# Altium footprint library HDMI_to_RGB.PcbLib: 21 footprints (part 1 of 2)
Each footprint in its own frame and in the unit in brackets; x right, y up, seen from the top. Pads: shape width x height; smd on the part's side, far side on the other; paste and mask are expansions set on the pad; w line width, h text height; cw(c..) or ccw(c..) is an arc to the next point about the centre after c.
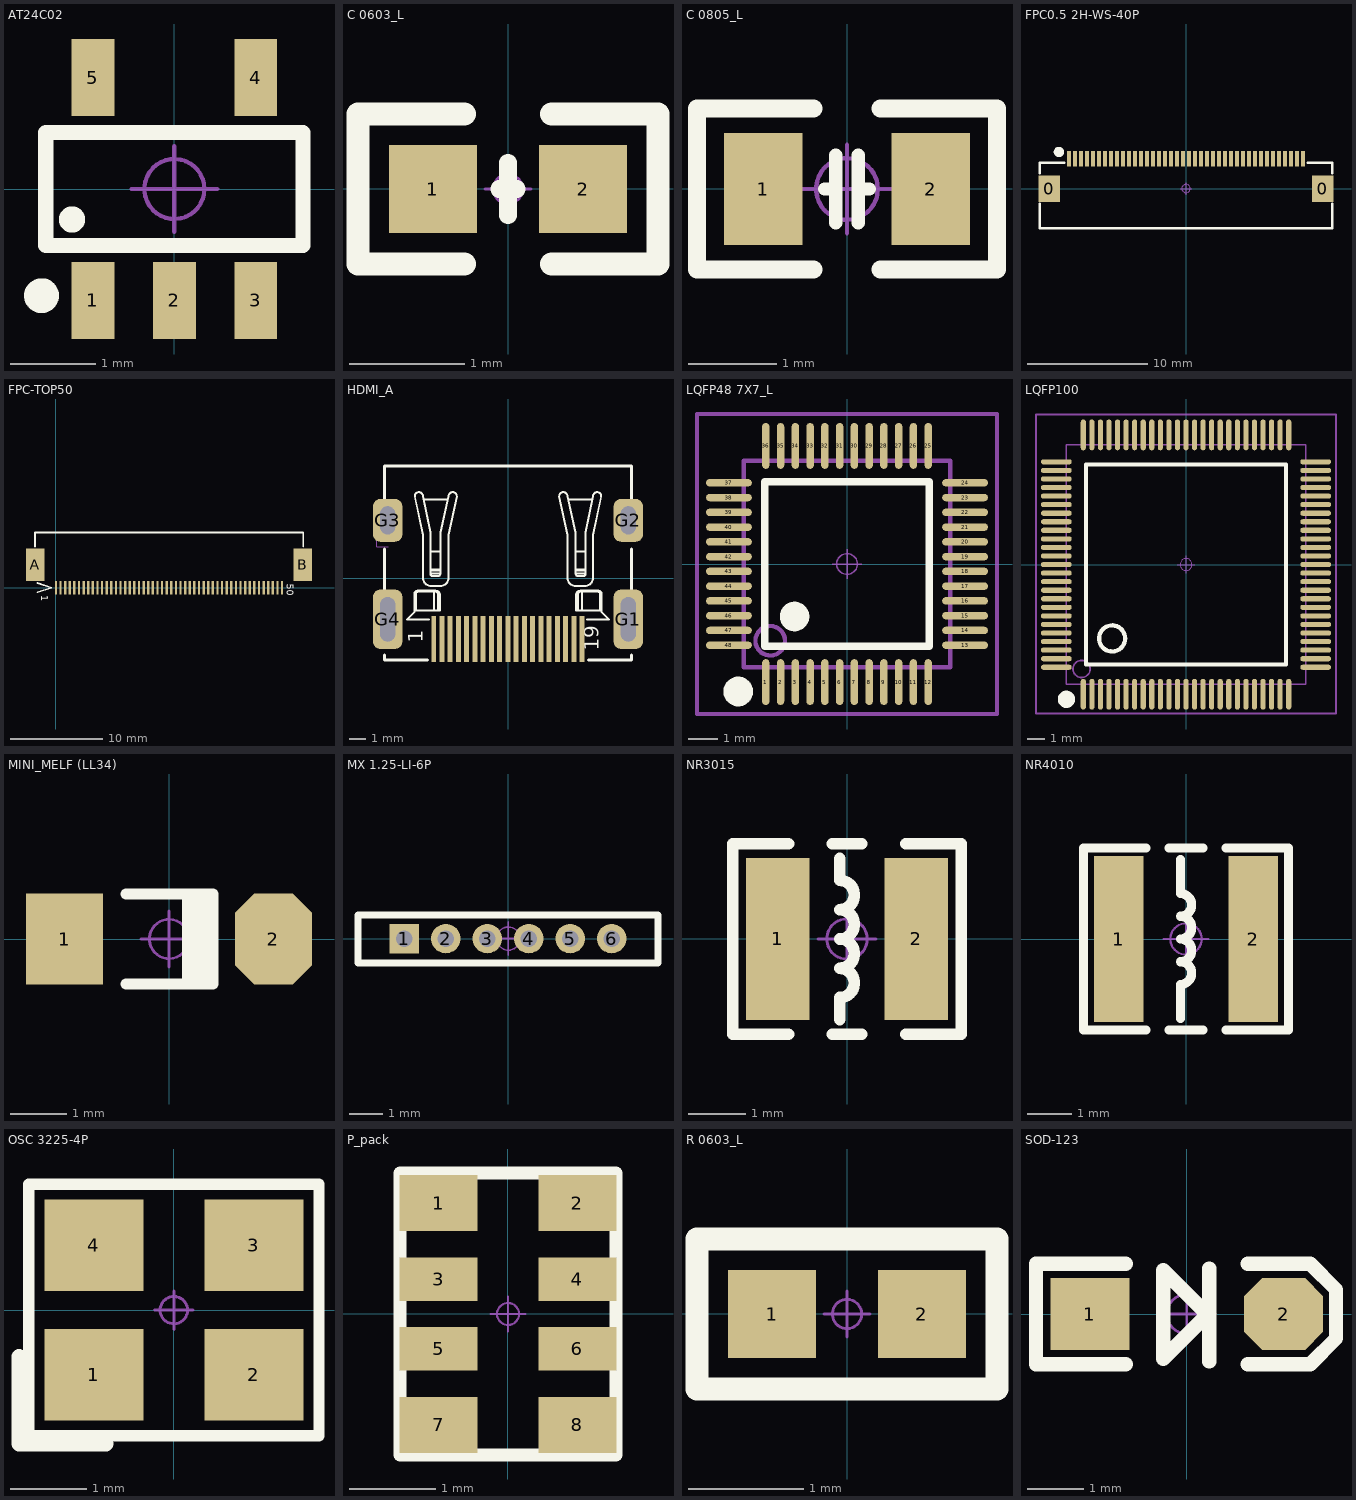
[diagram p0: the footprints below, top view; thin cyan lines are the x and y axes]

## AT24C02 [mm]
pads (5):
  rect 0.5x0.9 smd: 1(-0.95,-1.3) 2(0,-1.3) 3(0.95,-1.3) 4(0.95,1.3) 5(-0.95,1.3)
Top Overlay:
  circle w0.254: c-1.549,-1.245 r0.076
  circle w0.254: c-1.194,-0.356 r0.025
  lines w0.178: -1.5,-0.66 -1.5,0.66 1.5,0.66 1.5,-0.66 -1.5,-0.66
Mechanical 15:
  circle w0.05: c0,0 r0.35
  lines w0.05: -0.5,0 0.5,0 ; 0,-0.5 0,0.5
3D body "SOT23-5.STEP": height 1.15, standoff -0.03, extent -1.5,-1.403 1.5,1.403

## C 0603_L [mil] "无极性贴片电容"
pads (2):
  rect 30x30 smd: 1(-25.59,0) 2(25.59,0)
Top Overlay:
  lines w6: -3,0 0,0 3,0 ; 0,-9 0,9
  lines w8: -15,-25.59 -51.18,-25.59 -51.18,25.59 -15,25.59 ; 15,-25.59 51.18,-25.59 51.18,25.59 15,25.59
Mechanical 15:
  circle w1: c0,0 r5
  lines w1: -7.87,0 7.87,0 ; 0,-7.87 0,7.87
3D body "C 0603.STEP": height 31.89, standoff -0.39, extent -31.5,-16.14 31.5,16.14

## C 0805_L [mil] "无极性贴片电容"
height 19.68
pads (2):
  rect 35x50 smd: 1(-37.4,0) 2(37.4,0)
Top Overlay:
  lines w6: -10,0 -5,0 ; -5,-15 -5,15 ; 5,-15 5,15 ; 5,0 10,0
  lines w8: -15,-36 -66.93,-36 -66.93,36 -15,36 ; 15,-36 66.93,-36 66.93,36 15,36
Mechanical 15:
  circle w1.97: c0,0 r13.78
  circle w1.97: c0,0 r13.78
  lines w1.97: -19.68,0 19.68,0 -19.68,0 ; 0,-19.68 0,19.68 0,-19.68
3D body "C 0805.STEP": height 20.08, standoff -0.39, extent -39.37,-24.02 39.37,24.02

## FPC0.5 2H-WS-40P [mm] "长：24.2mm，宽：5.2mm，高：2mm"
pads (42):
  rect 1.8x2.2 smd: 0(-11.4,0) 0(11.4,0)
  rect 0.3x1.3 smd: 1(-9.75,2.497) 2(-9.25,2.497) 3(-8.75,2.497) 4(-8.25,2.497) 5(-7.75,2.497) 6(-7.25,2.497) 7(-6.75,2.497) 8(-6.25,2.497) 9(-5.75,2.497) 10(-5.25,2.497) 11(-4.75,2.497) 12(-4.25,2.497) 13(-3.75,2.497) 14(-3.25,2.497) 15(-2.75,2.497) 16(-2.25,2.497) 17(-1.75,2.497) 18(-1.25,2.497) 19(-0.75,2.497) 20(-0.25,2.497) 21(0.25,2.497) 22(0.75,2.497) 23(1.25,2.497) 24(1.75,2.497) 25(2.25,2.497) 26(2.75,2.497) 27(3.25,2.497) 28(3.75,2.497) 29(4.25,2.497) 30(4.75,2.497) 31(5.25,2.497) 32(5.75,2.497) 33(6.25,2.497) 34(6.75,2.497) 35(7.25,2.497) 36(7.75,2.497) 37(8.25,2.497) 38(8.75,2.497) 39(9.25,2.497) 40(9.75,2.497)
Top Overlay:
  circle w0.5: c-10.594,3.048 r0.18
  lines w0.2: -12.175,-1.27 -12.175,-3.302 12.175,-3.302 12.175,-1.27 ; -12.175,1.27 -12.175,2.159 -10.143,2.159 ; 10.143,2.159 12.175,2.159 12.175,1.27
Mechanical 15:
  circle w0.05: c0,0 r0.35
  lines w0.05: -0.5,0 0.5,0 ; 0,-0.5 0,0.5
3D body "FPC0.5 2H-S-W-40P.STEP": height 2, standoff -0.01, extent -12.1,-3.15 12.1,2.85

## FPC-TOP50 [mm]
pads (52):
  rect 0.25x1.5 smd: 1(0,0) 2(0.5,0) 3(1,0) 4(1.5,0) 5(2,0) 6(2.5,0) 7(3,0) 8(3.5,0) 9(4,0) 10(4.5,0) 11(5,0) 12(5.5,0) 13(6,0) 14(6.5,0) 15(7,0) 16(7.5,0) 17(8,0) 18(8.5,0) 19(9,0) 20(9.5,0) 21(10,0) 22(10.5,0) 23(11,0) 24(11.5,0) 25(12,0) 26(12.5,0) 27(13,0) 28(13.5,0) 29(14,0) 30(14.5,0) 31(15,0) 32(15.5,0) 33(16,0) 34(16.5,0) 35(17,0) 36(17.5,0) 37(18,0) 38(18.5,0) 39(19,0) 40(19.5,0) 41(20,0) 42(20.5,0) 43(21,0) 44(21.5,0) 45(22,0) 46(22.5,0) 47(23,0) 48(23.5,0) 49(24,0) 50(24.5,0)
  rect 2x3.5 smd: A(-2.25,2.5) B(26.75,2.5)
Top Overlay:
  lines w0.2: -2,-0.5 -0.5,0 -2,0.5
  lines w0.203: -2.286,4.47 -2.286,5.969 22.306,5.969 26.797,5.969 26.797,4.47
  text "50" at 25.022,0.432 h0.76
  text "1" at -1.597,-0.838 h0.76

## HDMI_A [mm]
pads (23):
  rect 0.3x2.794 smd mask+0.05: 1(-4.507,-3.697) 2(-4.007,-3.697) 3(-3.507,-3.697) 4(-3.007,-3.697) 5(-2.507,-3.697) 6(-2.007,-3.697) 7(-1.507,-3.697) 8(-1.007,-3.697) 9(-0.507,-3.697) 10(-0.007,-3.697) 11(0.493,-3.697) 12(0.993,-3.697) 13(1.493,-3.697) 14(1.993,-3.697) 15(2.493,-3.697) 16(2.993,-3.697) 17(3.493,-3.697) 18(3.993,-3.697) 19(4.493,-3.697)
  rrect50% 1.8x3.6 hole 0.9 slot 2.7 at 90 deg: G1(7.302,-2.5) G4(-7.302,-2.5)
  rrect50% 1.8x2.6 hole 0.9 slot 1.7 at 90 deg: G2(7.302,3.5) G3(-7.302,3.5)
Top Overlay:
  lines w0.12: -5.686,-1.967 -4.136,-1.967 -4.136,-1.017 ccw(c-4.386,-1.017) -4.386,-0.767 -5.486,-0.767 ccw(c-5.486,-0.967) -5.686,-0.967 -5.686,-2.067 -6.136,-2.517 -4.786,-2.517 ; -5.586,-1.967 -5.586,-1.017 -5.586,-0.967 cw(c-5.436,-0.967) -5.436,-0.817 -4.436,-0.817 cw(c-4.436,-1.017) -4.236,-1.017 -4.236,-1.967 ; -5.107,4.764 -3.657,4.764 ; -4.707,0.464 -4.107,0.464 ; -4.707,0.514 -4.107,0.514 ; -4.707,1.614 -4.107,1.614 ; -4.486,-1.967 -4.486,-0.817 ; 3.657,4.764 5.107,4.764 ; 4.107,0.464 4.707,0.464 ; 4.107,0.514 4.707,0.514 ; 4.107,1.614 4.707,1.614 ; 4.236,-1.967 4.236,-1.017 cw(c4.436,-1.017) 4.436,-0.817 5.436,-0.817 cw(c5.436,-0.967) 5.586,-0.967 5.586,-1.017 5.586,-1.967 ; 4.486,-1.967 4.486,-0.817 ; 4.786,-2.517 6.136,-2.517 5.686,-2.067 5.686,-0.967 ccw(c5.486,-0.967) 5.486,-0.767 4.386,-0.767 ccw(c4.386,-1.017) 4.136,-1.017 4.136,-1.967 5.686,-1.967 ; -4.707,0.264 ccw(c-4.557,0.264) -4.557,0.114 -4.257,0.114 ccw(c-4.257,0.264) -4.107,0.264 ; -4.707,0.264 -4.107,0.264 ; -4.707,0.264 -4.707,2.764 -5.157,4.964 ccw(c-5.407,4.964) -5.407,5.214 ccw(c-5.407,4.964) -5.657,4.964 -5.157,2.614 -5.157,0.014 ccw(c-4.657,0.014) -4.657,-0.486 -4.157,-0.486 -4.107,-0.486 ccw(c-4.107,0.014) -3.607,0.014 -3.607,2.614 -3.107,4.964 ccw(c-3.357,4.964) -3.357,5.214 ; -4.107,0.264 -4.107,0.364 -4.107,2.764 -3.607,4.964 cw(c-3.357,4.964) -3.357,5.214 ; -3.357,5.214 -3.357,5.214 ; 3.357,5.214 ccw(c3.357,4.964) 3.107,4.964 3.607,2.614 3.607,0.014 ccw(c4.107,0.014) 4.107,-0.486 4.157,-0.486 4.657,-0.486 ccw(c4.657,0.014) 5.157,0.014 5.157,2.614 5.657,4.964 ccw(c5.407,4.964) 5.407,5.214 ccw(c5.407,4.964) 5.157,4.964 4.707,2.764 4.707,0.264 ; 3.357,5.214 cw(c3.357,4.964) 3.607,4.964 4.107,2.764 4.107,0.364 4.107,0.264 ; 3.357,5.214 3.357,5.214 ; 4.107,0.264 ccw(c4.257,0.264) 4.257,0.114 4.557,0.114 ccw(c4.557,0.264) 4.707,0.264 ; 4.107,0.264 4.707,0.264
  lines w0.203: -7.493,-4.675 -7.493,-4.973 -4.895,-4.973 ; -7.493,-0.801 -7.493,1.765 ; -7.493,4.672 -7.493,6.8 7.493,6.8 7.493,4.672 ; 4.895,-4.973 7.493,-4.973 7.493,-4.675 ; 7.493,-0.801 7.493,1.765
  text "19" at 5.818,-4.425 h1.5
  text "1" at -4.857,-3.925 h1.5
Mechanical 14:
  lines w0.01: -7.257,1.9 -7.957,1.9 -7.957,2.9 -7.257,2.9
3D body "57283.stp": height 6.08, standoff -2.2, extent -7.507,-4.5 7.493,7.5

## LQFP48 7X7_L [mm] "48脚，体宽7x7mm，脚距0.5mm"
height 1.6
pads (48):
  oval 0.25x1.55 smd: 1(-2.75,-4) 2(-2.25,-4) 3(-1.75,-4) 4(-1.25,-4) 5(-0.75,-4) 6(-0.25,-4) 7(0.25,-4) 8(0.75,-4) 9(1.25,-4) 10(1.75,-4) 11(2.25,-4) 12(2.75,-4) 25(2.75,4) 26(2.25,4) 27(1.75,4) 28(1.25,4) 29(0.75,4) 30(0.25,4) 31(-0.25,4) 32(-0.75,4) 33(-1.25,4) 34(-1.75,4) 35(-2.25,4) 36(-2.75,4)
  oval 1.55x0.25 smd: 13(4,-2.75) 14(4,-2.25) 15(4,-1.75) 16(4,-1.25) 17(4,-0.75) 18(4,-0.25) 19(4,0.25) 20(4,0.75) 21(4,1.25) 22(4,1.75) 23(4,2.25) 24(4,2.75) 37(-4,2.75) 38(-4,2.25) 39(-4,1.75) 40(-4,1.25) 41(-4,0.75) 42(-4,0.25) 43(-4,-0.25) 44(-4,-0.75) 45(-4,-1.25) 46(-4,-1.75) 47(-4,-2.25) 48(-4,-2.75)
Top Overlay:
  circle w0.5: c-1.778,-1.778 r0.25
  circle w0.508: c-3.683,-4.318 r0.25
  lines w0.254: -2.794,-2.794 2.794,-2.794 2.794,2.794 -2.794,2.794 -2.794,-2.794
Mechanical 13:
  circle w0.15: c-2.6,-2.6 r0.5
  lines w0.15: -3.5,-3.5 3.5,-3.5 3.5,3.5 -3.5,3.5 -3.5,-3.5
Mechanical 15:
  circle w0.05: c0,0 r0.35
  lines w0.05: -0.5,0 0.5,0 ; 0,-0.5 0,0.5
  lines w0.15: -5.08,-5.08 5.08,-5.08 5.08,5.08 -5.08,5.08 -5.08,-5.08
3D body "LQFP48-7x7.STEP": height 1.45, standoff 0, extent -4.503,-4.503 4.503,4.503

## LQFP100 [mm]
pads (100):
  oval 0.3x1.8 smd: 1(-6,-7.575) 2(-5.5,-7.575) 3(-5,-7.575) 4(-4.5,-7.575) 5(-4,-7.575) 6(-3.5,-7.575) 7(-3,-7.575) 8(-2.5,-7.575) 9(-2,-7.575) 10(-1.5,-7.575) 11(-1,-7.575) 12(-0.5,-7.575) 13(0,-7.575) 14(0.5,-7.575) 15(1,-7.575) 16(1.5,-7.575) 17(2,-7.575) 18(2.5,-7.575) 19(3,-7.575) 20(3.5,-7.575) 21(4,-7.575) 22(4.5,-7.575) 23(5,-7.575) 24(5.5,-7.575) 25(6,-7.575) 51(6,7.575) 52(5.5,7.575) 53(5,7.575) 54(4.5,7.575) 55(4,7.575) 56(3.5,7.575) 57(3,7.575) 58(2.5,7.575) 59(2,7.575) 60(1.5,7.575) 61(1,7.575) 62(0.5,7.575) 63(0,7.575) 64(-0.5,7.575) 65(-1,7.575) 66(-1.5,7.575) 67(-2,7.575) 68(-2.5,7.575) 69(-3,7.575) 70(-3.5,7.575) 71(-4,7.575) 72(-4.5,7.575) 73(-5,7.575) 74(-5.5,7.575) 75(-6,7.575)
  oval 1.8x0.3 smd: 26(7.575,-6) 27(7.575,-5.5) 28(7.575,-5) 29(7.575,-4.5) 30(7.575,-4) 31(7.575,-3.5) 32(7.575,-3) 33(7.575,-2.5) 34(7.575,-2) 35(7.575,-1.5) 36(7.575,-1) 37(7.575,-0.5) 38(7.575,0) 39(7.575,0.5) 40(7.575,1) 41(7.575,1.5) 42(7.575,2) 43(7.575,2.5) 44(7.575,3) 45(7.575,3.5) 46(7.575,4) 47(7.575,4.5) 48(7.575,5) 49(7.575,5.5) 50(7.575,6) 76(-7.575,6) 77(-7.575,5.5) 78(-7.575,5) 79(-7.575,4.5) 80(-7.575,4) 81(-7.575,3.5) 82(-7.575,3) 83(-7.575,2.5) 84(-7.575,2) 85(-7.575,1.5) 86(-7.575,1) 87(-7.575,0.5) 88(-7.575,0) 89(-7.575,-0.5) 90(-7.575,-1) 91(-7.575,-1.5) 92(-7.575,-2) 93(-7.575,-2.5) 94(-7.575,-3) 95(-7.575,-3.5) 96(-7.575,-4) 97(-7.575,-4.5) 98(-7.575,-5) 99(-7.575,-5.5) 100(-7.575,-6)
Top Overlay:
  circle w0.254: c-4.318,-4.318 r0.762
  circle w0.508: c-6.985,-7.874 r0.25
  lines w0.254: -5.842,-5.842 5.842,-5.842 5.842,5.842 -5.842,5.842 -5.842,-5.842
Mechanical 13:
  circle w0.1: c-6.1,-6.1 r0.5
  lines w0.1: -7,-7 -7,7 7,7 7,-7 -7,-7
Mechanical 15:
  circle w0.05: c0,0 r0.35
  lines w0.05: -0.5,0 0.5,0 ; 0,-0.5 0,0.5
  lines w0.1: -8.763,-8.7 -8.763,8.763 8.763,8.763 8.763,-8.7 -8.763,-8.7
3D body "LQFP100-14x14.STEP": height 1.45, standoff -0.01, extent -8.003,-8.003 8.003,8.003

## MINI_MELF (LL34) [mm] "1.5*3.4mm(直径，脚距）"
pads (2):
  rect 1.37x1.62 smd: 1(-1.855,0)
  oct 1.37x1.62 smd: 2(1.855,0)
Top Overlay:
  rectangle: 0.227,-0.8 0.777,0.8
  lines w0.2: -0.762,-0.8 0.777,-0.8 0.777,0.8 -0.762,0.8
Mechanical 15:
  circle w0.05: c0,0 r0.35
  lines w0.05: -0.5,0 0.5,0 ; 0,-0.5 0,0.5
3D body "MINI-MELF.STEP": height 1.5, standoff 0, extent -1.701,-0.75 1.701,0.75

## MX 1.25-LI-6P [mil] "长：9.25mm，宽：3.2mm，高：4.2mm"
pads (6):
  rect 35x35 hole 19.68: 1(-123.43,0)
  round 35 hole 19.68: 2(-74.21,0) 3(-25,0) 4(24.21,0) 5(73.43,0) 6(122.64,0)
Top Overlay:
  lines w7.87: -178.43,-29 177.57,-29 177.57,28 -178.43,28 -178.43,-29
Mechanical 15:
  circle w1.97: c0,0 r13.78
  lines w1.97: -19.69,0 19.68,0 ; 0,-19.68 0,19.68
3D body "MOLEX1.25-LI-6P.STEP": height 167.32, standoff -92.52, extent -182.09,-45.28 182.09,80.71

## NR3015 [mm]
pads (2):
  rect 1.1x2.8 smd: 1(-1.2,0) 2(1.2,0)
Top Overlay:
  lines w0.203: -1.016,-1.651 -1.981,-1.651 -1.981,1.651 -1.016,1.651 ; -0.254,-1.651 0.254,-1.651 ; -0.254,1.651 0.254,1.651 ; -0.127,-1.397 -0.127,-1.016 ccw(c-0.127,-0.762) -0.127,-0.508 ccw(c-0.127,-0.254) -0.127,0 ccw(c-0.127,0.254) -0.127,0.508 ccw(c-0.127,0.762) -0.127,1.016 -0.127,1.397 ; 1.016,-1.651 1.981,-1.651 1.981,1.651 1.016,1.651
Mechanical 15:
  circle w0.05: c0,0 r0.35
  lines w0.05: -0.5,0 0.5,0 ; 0,-0.5 0,0.5
3D body "NR3015.STEP": height 1.45, standoff 0.05, extent -1.5,-1.5 1.5,1.5

## NR4010 [mm] "4.0mm*4.0mm*1.0mm(长*宽*高）"
pads (2):
  rect 1.1x3.7 smd: 1(-1.5,0) 2(1.5,0)
Top Overlay:
  lines w0.203: -0.889,-2.032 -2.286,-2.032 -2.286,2.032 -0.889,2.032 ; -0.381,-2.032 0.381,-2.032 ; -0.381,2.032 0.381,2.032 ; -0.127,-1.778 -0.127,-1.016 ccw(c-0.127,-0.762) -0.127,-0.508 ccw(c-0.127,-0.254) -0.127,0 ccw(c-0.127,0.254) -0.127,0.508 ccw(c-0.127,0.762) -0.127,1.016 -0.127,1.778 ; 0.889,-2.032 2.286,-2.032 2.286,2.032 0.889,2.032
Mechanical 15:
  circle w0.05: c0,0 r0.35
  lines w0.05: -0.5,0 0.5,0 ; 0,-0.5 0,0.5
3D body "NR4010.STEP": height 1.1, standoff 0, extent -2,-2 2,2

## OSC 3225-4P [mm]
pads (4):
  rect 1.3x1.2 smd: 1(-1.05,-0.85) 2(1.05,-0.85) 3(1.05,0.85) 4(-1.05,0.85)
Top Overlay:
  lines w0.15: -1.905,-1.651 1.905,-1.651 1.905,1.651 -1.905,1.651 -1.905,-1.651
  lines w0.2: -2.032,-1.753 -0.889,-1.753 ; -2.032,-1.727 -2.032,-0.61
Mechanical 15:
  circle w0.04: c0,0 r0.18
  lines w0.04: -0.254,0 0.254,0 ; 0,-0.254 0,0.254
3D body "OSC 3225-4.STEP": height 0.7, standoff -0.02, extent -1.6,-1.25 1.6,1.25

## P_pack [mm]
pads (8):
  rect 0.9x0.65 smd: 1(-0.8,1.28) 2(0.8,1.28) 7(-0.8,-1.28) 8(0.8,-1.28)
  rect 0.9x0.5 smd: 3(-0.8,0.4) 4(0.8,0.4) 5(-0.8,-0.4) 6(0.8,-0.4)
Top Overlay:
  lines w0.152: -1.245,-1.626 1.245,-1.626 1.245,1.626 -1.245,1.626 -1.245,-1.626
Mechanical 15:
  circle w0.025: c0,0 r0.127
  lines w0.025: -0.2,0 0.2,0 ; 0,-0.2 0,0.2
3D body "RCA-8P4R-0603.STEP": height 0.6, standoff 0, extent -0.8,-1.6 0.8,1.6

## R 0603_L [mil] "1/10W贴片电阻"
pads (2):
  rect 30x30 smd: 1(-25.59,0) 2(25.59,0)
Top Overlay:
  lines w8: -51.18,-25.59 51.18,-25.59 51.18,25.59 -51.18,25.59 -51.18,-25.59
Mechanical 15:
  circle w1: c0,0 r5
  lines w1: -7.87,0 7.87,0 ; 0,-7.87 0,7.87
3D body "R 0603.STEP": height 15.79, standoff -0.13, extent -31.49,-15.74 31.5,15.75

## SOD-123 [mil] "2.7x1.6X1.1mm（长宽高，不包括引脚）"
pads (2):
  rect 55x50 smd: 1(-67.5,0)
  oct 55x50 smd: 2(67.5,0)
Top Overlay:
  lines w10: -42.5,-35 -105,-35 -105,35 -42.5,35 ; 14,-0.8 -16.4,-31.2 -16.4,30.5 15.6,-1.5 ; 15.6,-33.1 15.6,31.7 ; 42.5,-35 86,-35 104,-17 104,17 86,35 42.5,35
Mechanical 15:
  circle w1.97: c0,0 r13.78
  lines w1.97: -19.68,0 19.68,0 ; 0,-19.68 0,19.68
3D body "SOD-123.STEP": height 48.03, standoff 0, extent -72.84,-31.5 72.83,31.5